# Altium footprint library Chronos.PcbLib: 65 footprints (part 5 of 5)
Each footprint in its own frame and in the unit in brackets; x right, y up, seen from the top. Pads: shape width x height; smd on the part's side, far side on the other; paste and mask are expansions set on the pad; w line width, h text height; cw(c..) or ccw(c..) is an arc to the next point about the centre after c.
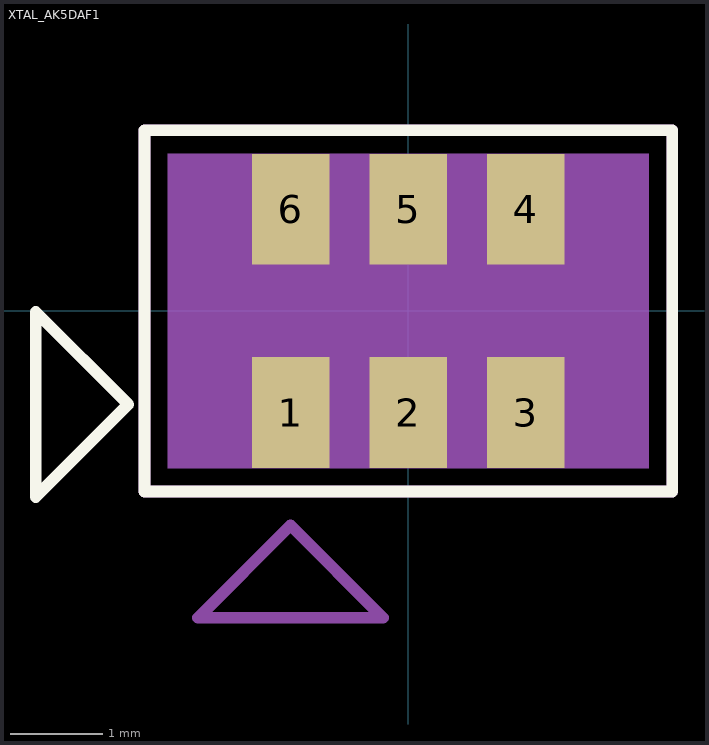
[diagram p4: the footprint, top view; thin cyan lines are the x and y axes]

## XTAL_AK5DAF1 [mm] "XTAL_AK5DAF1"
pads (6):
  rect 0.84x1.2 smd: 1(-1.27,-1.1) 2(0,-1.1) 3(1.27,-1.1) 4(1.27,1.1) 5(0,1.1) 6(-1.27,1.1)
Top Overlay:
  lines w0.127: -4.029,-2.011 -3.029,-1.011 -4.029,-0.011 -4.029,-2.011 ; -2.854,-1.954 2.854,-1.954 2.854,1.954 -2.854,1.954 -2.854,-1.954
Top 3D Body:
  region: 2.6,-1.7 2.6,1.7 -2.6,1.7 -2.6,-1.7
Top Assembly:
  lines w0.127: -2.854,-1.954 2.854,-1.954 2.854,1.954 -2.854,1.954 -2.854,-1.954 ; -2.275,-3.318 -0.275,-3.318 -1.275,-2.318 -2.275,-3.318
Mechanical 29:
  text "5" at -0.406,1.1 h0.51
  text "4" at 0.864,1.1 h0.51
  text "1" at -1.676,-1.1 h0.51
  text "6" at -1.676,1.1 h0.51
  text "2" at -0.406,-1.1 h0.51
  text "3" at 0.864,-1.1 h0.51
Bottom Assembly:
  text ".Designator" at -3.026,5.618 h1.02
3D body: height 3.81, standoff 0, extent -2.6,-1.7 2.6,1.7